# Altium footprint library connectors_socets.pcblib: 601 footprints (part 6 of 38)
Each footprint in its own frame and in the unit in brackets; x right, y up, seen from the top. Pads: shape width x height; smd on the part's side, far side on the other; paste and mask are expansions set on the pad; w line width, h text height; cw(c..) or ccw(c..) is an arc to the next point about the centre after c.
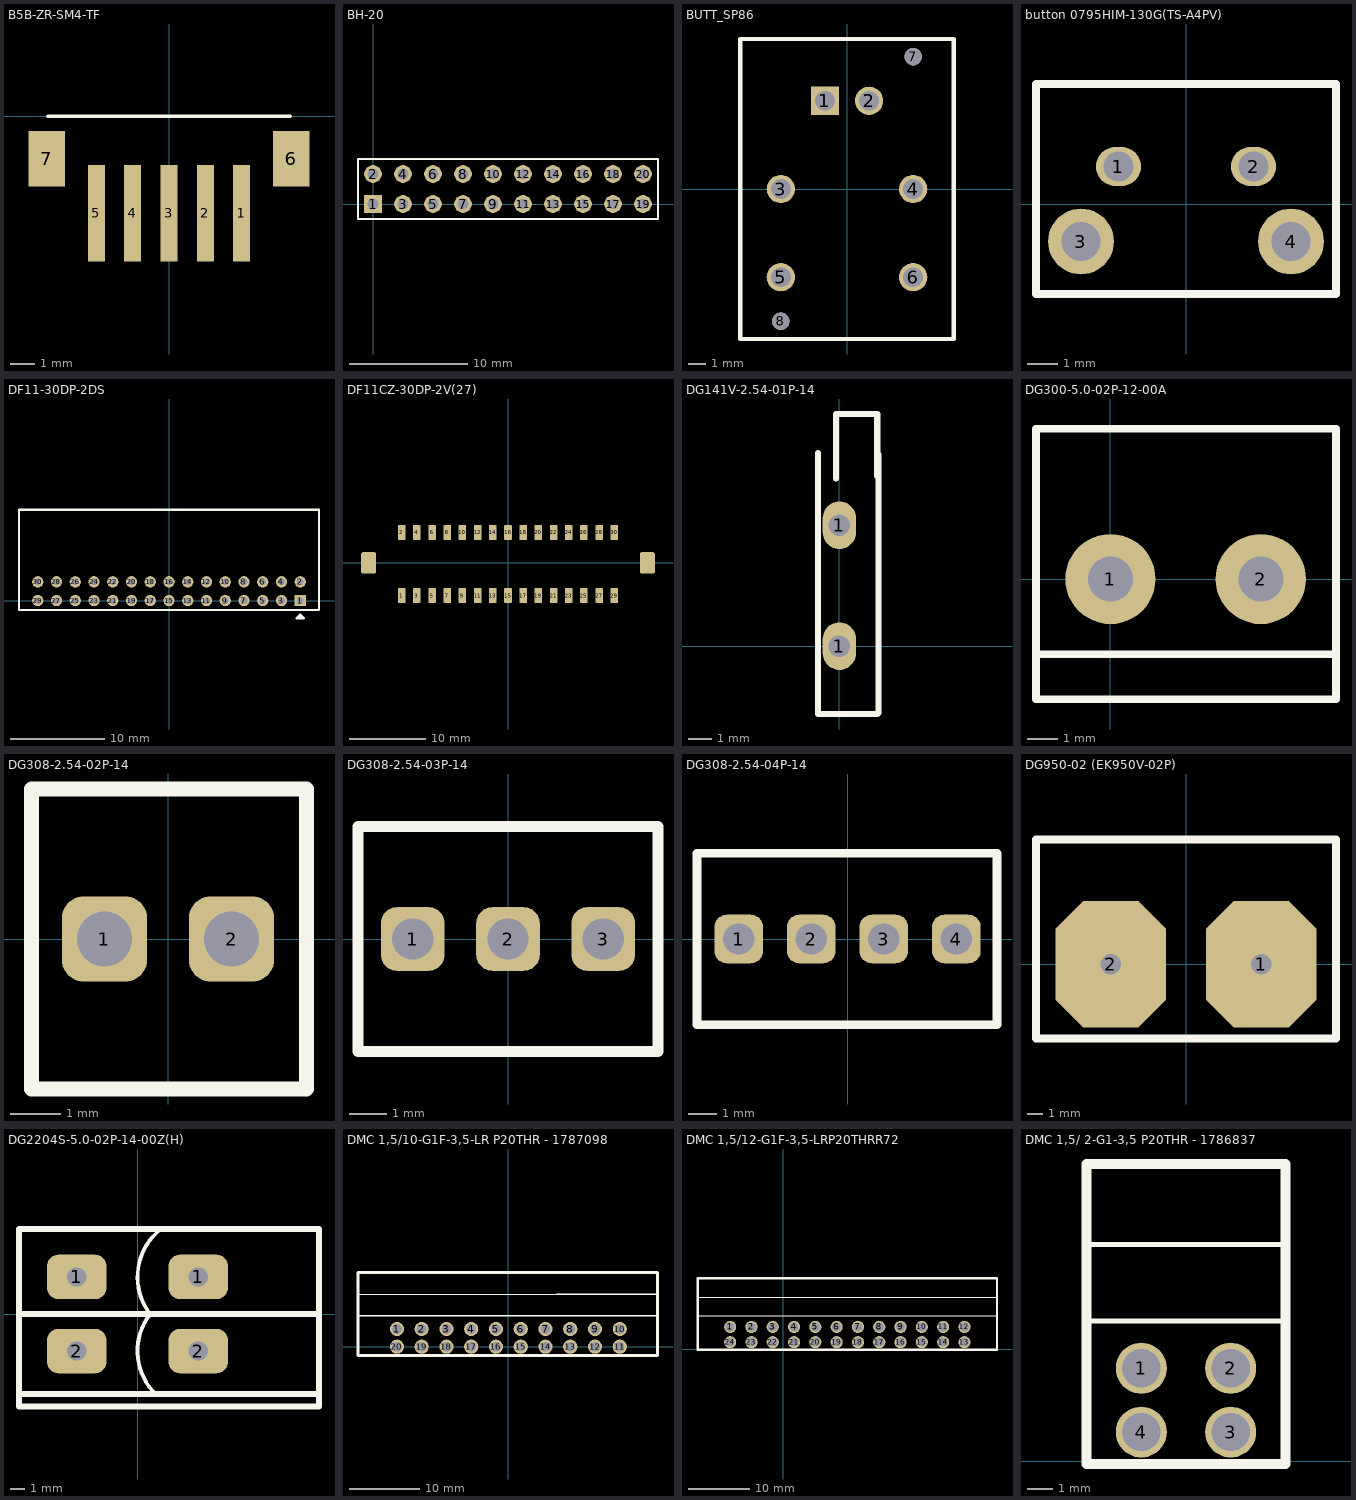
[diagram p5: the footprints below, top view; thin cyan lines are the x and y axes]

## B5B-ZR-SM4-TF [mm] "Connector"
pads (7):
  rect 0.7x4 smd: 1(3,-4) 2(1.5,-4) 3(0,-4) 4(-1.5,-4) 5(-3,-4)
  rect 1.5x2.3 smd: 6(5.05,-1.75) 7(-5.05,-1.75)
Top Overlay:
  lines w0.15: -5,0 5,0
3D body "B5B-ZR-SM4-TF.STEP": height 5, standoff 0, extent -5.25,-5.2 5.25,0

## BH-20 [mm] "Connector; Header; 10x2 Position"
height 9
pads (20):
  rect 1.5x1.5 hole 0.9: 1(0,0)
  round 1.5 hole 0.9: 2(0,2.54) 3(2.54,0) 4(2.54,2.54) 5(5.08,0) 6(5.08,2.54) 7(7.62,0) 8(7.62,2.54) 9(10.16,0) 10(10.16,2.54) 11(12.7,0) 12(12.7,2.54) 13(15.24,0) 14(15.24,2.54) 15(17.78,0) 16(17.78,2.54) 17(20.32,0) 18(20.32,2.54) 19(22.86,0) 20(22.86,2.54)
Top Overlay:
  lines w0.2: -1.27,-1.27 -1.27,3.81 0.635,3.81 24.13,3.81 24.13,-1.27 0.635,-1.27 -1.27,-1.27
3D body "BH-20.step": height 8.75, standoff -3.1, extent -5.08,-3.105 27.94,5.995

## BUTT_SP86 [mil]
pads (8):
  rect 64x64 hole 45: 1(-50,200)
  round 64 hole 45: 2(50,200) 3(-150,0) 4(150,0) 5(-150,-200) 6(150,-200)
  round 39.37 hole 39.37 unplated: 7(150,300) 8(-150.09,-299.86)
Top Overlay:
  lines w10: -242,-340 -242,340 242,340 242,-340 -242,-340
3D body "button86.stp": height 515.75, standoff -145.67, extent -344.49,-345 344.48,351.85

## button 0795HIM-130G(TS-A4PV) [mm]
pads (4):
  oval 1.5x1.3 hole 1: 1(-2.25,1.25) 2(2.25,1.25)
  round 2.2 hole 1.3: 3(-3.5,-1.25) 4(3.5,-1.25)
Top Overlay:
  lines w0.254: -5,-3 5,-3 5,4 -5,4 -5,-3
3D body "User Library-TACT DIP 6X6 CORNER (SWITRONIC 0795).step": height 7.3, standoff -3.6, extent -3.97,-2.7 3.97,9.7

## DF11-30DP-2DS [mm] "Connector; Header; 15x2 Position"
pads (30):
  rect 1.2x1.2 hole 0.7: 1(14,0)
  round 1.2 hole 0.7: 2(14,2) 3(12,0) 4(12,2) 5(10,0) 6(10,2) 7(8,0) 8(8,2) 9(6,0) 10(6,2) 11(4,0) 12(4,2) 13(2,0) 14(2,2) 15(0,0) 16(0,2) 17(-2,0) 18(-2,2) 19(-4,0) 20(-4,2) 21(-6,0) 22(-6,2) 23(-8,0) 24(-8,2) 25(-10,0) 26(-10,2) 27(-12,0) 28(-12,2) 29(-14,0) 30(-14,2)
Top Overlay:
  lines w0.25: 14,-1.9 14,-1.5 ; 14,-1.5 13.6,-1.9 14.4,-1.9 14,-1.5 ; -16,-1 16,-1 16,9.7 -16,9.7 -16,-1
3D body "47410.stp": height 5.21, standoff -2.79, extent -16,-0.3 16,9.7

## DF11CZ-30DP-2V(27) [mm] "SMT Connector; Header; 15x2 Position"
pads (32):
  rrect25% 1x2 smd: 1(-14,-4.3) 2(-14,4) 3(-12,-4.3) 4(-12,4) 5(-10,-4.3) 6(-10,4) 7(-8,-4.3) 8(-8,4) 9(-6,-4.3) 10(-6,4) 11(-4,-4.3) 12(-4,4) 13(-2,-4.3) 14(-2,4) 15(0,-4.3) 16(0,4) 17(2,-4.3) 18(2,4) 19(4,-4.3) 20(4,4) 21(6,-4.3) 22(6,4) 23(8,-4.3) 24(8,4) 25(10,-4.3) 26(10,4) 27(12,-4.3) 28(12,4) 29(14,-4.3) 30(14,4)
  rrect25% 2x2.8 smd: ""(-18.35,0) ""(18.35,0)
3D body "DF11C-30DP-2V.stp": height 7.2, standoff -0.05, extent -18.75,-4.75 18.75,4.45

## DG141V-2.54-01P-14 [mm]
pads (2):
  oval 1.4x2 hole 0.9: 1(0,0) 1(0,5.08)
Top Overlay:
  lines w0.254: -0.9,7.852 -0.9,8.102 ; -0.9,7.95 -0.9,6.43 -0.9,3.73 -0.9,1.35 -0.9,-1.35 -0.9,-2.85 1.59,-2.85 1.64,-2.8 1.64,-1.4 1.64,1.4 1.64,3.68 1.64,6.48 1.64,7.9 ; -0.15,7.05 -0.15,9.75 1.04,9.75 1.59,9.75 1.59,7.15 ; 1.64,7.827 1.64,8.052
3D body "User Library-DG141V.step": height 13.6, standoff -3.5, extent -0.925,-2.85 1.615,9.75

## DG300-5.0-02P-12-00A [mm]
pads (2):
  round 3 hole 1.5: 1(0,0) 2(5,0)
Top Overlay:
  lines w0.254: -2.375,-2.5 7.375,-2.5 ; -2.475,-4 7.5,-4 7.5,5 -2.475,5 -2.475,-4
3D body "User Library-DG300-5_0-02P-12.SLDPRT": height 12.61, standoff -4.39, extent -2.5,-4 7.5,5

## DG308-2.54-02P-14 [mm] "DG308-2.54-02P-14"
pads (2):
  rrect50% 1.7x1.7 hole 1.1 unplated: 1(-1.27,0) 2(1.27,0)
Top Overlay:
  lines w0.3: -2.73,-3 -2.73,3 2.77,3 2.77,-3 -2.73,-3
3D body "User Library-DG308-2.step": height 7.93, standoff -3.9, extent -2.88,-3.022 2.92,3

## DG308-2.54-03P-14 [mm] "DG308-2.54-03P-14/308-031-14"
pads (3):
  rrect50% 1.7x1.7 hole 1.1 unplated: 1(-2.54,0) 2(0,0) 3(2.54,0)
Top Overlay:
  lines w0.3: -4,-3 -4,3 4,3 4,-3 -4,-3
3D body "User Library-DG308-3.step": height 7.83, standoff -4, extent -4.051,-2.974 3.949,3.048

## DG308-2.54-04P-14 [mm] "DG308-2.54-04P-14"
pads (4):
  rrect50% 1.7x1.7 hole 1.1 unplated: 1(-3.81,0) 2(-1.27,0) 3(1.27,0) 4(3.81,0)
Top Overlay:
  lines w0.3: -5.27,-3 -5.27,3 5.23,3 5.23,-3 -5.27,-3
3D body "User Library-DG308-4.step": height 7.93, standoff -3.9, extent -5.52,-3 5.48,3.022

## DG950-02 (EK950V-02P) [mm] "Header 2-pin 9.52"
pads (2):
  oct 7x8 hole 1.3: 1(4.76,0) 2(-4.76,0)
Top Overlay:
  lines w0.5: -9.5,-4.7 0,-4.7 9.5,-4.7 9.5,7.9 0,7.9 -9.5,7.9 -9.5,-4.7

## DG2204S-5.0-02P-14-00Z(H) [mm] "2 pin 5 mm Pitch"
pads (4):
  rrect50% 4x3 hole 1.3: 1(-4.1,2.5) 1(4.1,2.5) 2(-4.1,-2.5) 2(4.1,-2.5)
Top Overlay:
  lines w0.254: 0.819,-0.041 ccw(c4.1,-2.5) 1.215,-5.413 ; 0.882,-0.041 cw(c4.1,2.5) 1.511,5.679
  lines w0.4: -8,-5.413 12,-5.413 ; -8,0 12.25,0 0,0 ; -8,-6.25 -8,5.75 12.25,5.75 12.25,-6.25 -8,-6.25
3D body "DG2204S-5.0-02P-1Y-00Z-C (1).stp": height 24.41, standoff -3.43, extent -7.825,-6.175 12.025,5.575

## DMC 1,5/10-G1F-3,5-LR P20THR - 1787098 [mm] "Connector LR"
pads (20):
  round 2 hole 1.4: 1(-15.75,2.5) 2(-12.25,2.5) 3(-8.75,2.5) 4(-5.25,2.5) 5(-1.75,2.5) 6(1.75,2.5) 7(5.25,2.5) 8(8.75,2.5) 9(12.25,2.5) 10(15.75,2.5) 11(15.75,0) 12(12.25,0) 13(8.75,0) 14(5.25,0) 15(1.75,0) 16(-1.75,0) 17(-5.25,0) 18(-8.75,0) 19(-12.25,0) 20(-15.75,0)
Top Overlay:
  lines w0.2: -21.2,4.35 -7,4.35 20.9,4.35 ; -21.2,7.35 6.875,7.45 21.15,7.45
  lines w0.4: -21.25,-1.25 -21.25,10.5 21.1,10.5 21.1,-1.25 -21.25,-1.25
3D body "pxc_1787098_02_DMC-1-5-10-G1F-3-5-LR-P20THR_3D.stp": height 10.9, standoff -1.9, extent -21,-1.15 21,10.45

## DMC 1,5/12-G1F-3,5-LRP20THRR72 [mm] "Connector LR"
pads (24):
  round 2 hole 1.5: 1(-8.75,3.65) 2(-5.25,3.65) 3(-1.75,3.65) 4(1.75,3.65) 5(5.25,3.65) 6(8.75,3.65) 7(12.25,3.65) 8(15.75,3.65) 9(19.25,3.65) 10(22.75,3.65) 11(26.25,3.65) 12(29.75,3.65) 13(29.75,1.15) 14(26.25,1.15) 15(22.75,1.15) 16(19.25,1.15) 17(15.75,1.15) 18(12.25,1.15) 19(8.75,1.15) 20(5.25,1.15) 21(1.75,1.15) 22(-1.75,1.15) 23(-5.25,1.15) 24(-8.75,1.15)
Top Overlay:
  lines w0.2: -14.2,5.5 0,5.5 35.1,5.5 ; -14.2,8.5 0,8.5 35.1,8.5
  lines w0.4: -14.1,-0.1 -14.1,11.65 35.1,11.65 35.1,-0.1 -14.1,-0.1
3D body "pxc_1706067_02_DMC-1-5-12-G1F-3-5-LRP20THRR72_3D.stp": height 10.9, standoff -1.9, extent -14,0.05 35,11.65

## DMC 1,5/ 2-G1-3,5 P20THR - 1786837 [mm] "Connector LR"
pads (4):
  round 2 hole 1.5: 1(-8.75,3.65) 2(-5.25,3.65) 3(-5.25,1.15) 4(-8.75,1.15)
Top Overlay:
  lines w0.2: -10.9,5.5 -3.1,5.5 ; -10.9,8.5 -3.1,8.5
  lines w0.4: -10.9,-0.1 -10.9,11.65 -3.1,11.65 -3.1,-0.1 -10.9,-0.1
3D body "pxc_1786837_02_DMC-1-5-2-G1-3-5-P20THR_3D.stp": height 10.9, standoff -1.9, extent -10.9,0 -3.1,11.6